# Altium footprint library MyComponents_v2.5.PcbLib: 403 footprints (part 14 of 26)
Each footprint in its own frame and in the unit in brackets; x right, y up, seen from the top. Pads: shape width x height; smd on the part's side, far side on the other; paste and mask are expansions set on the pad; w line width, h text height; cw(c..) or ccw(c..) is an arc to the next point about the centre after c.
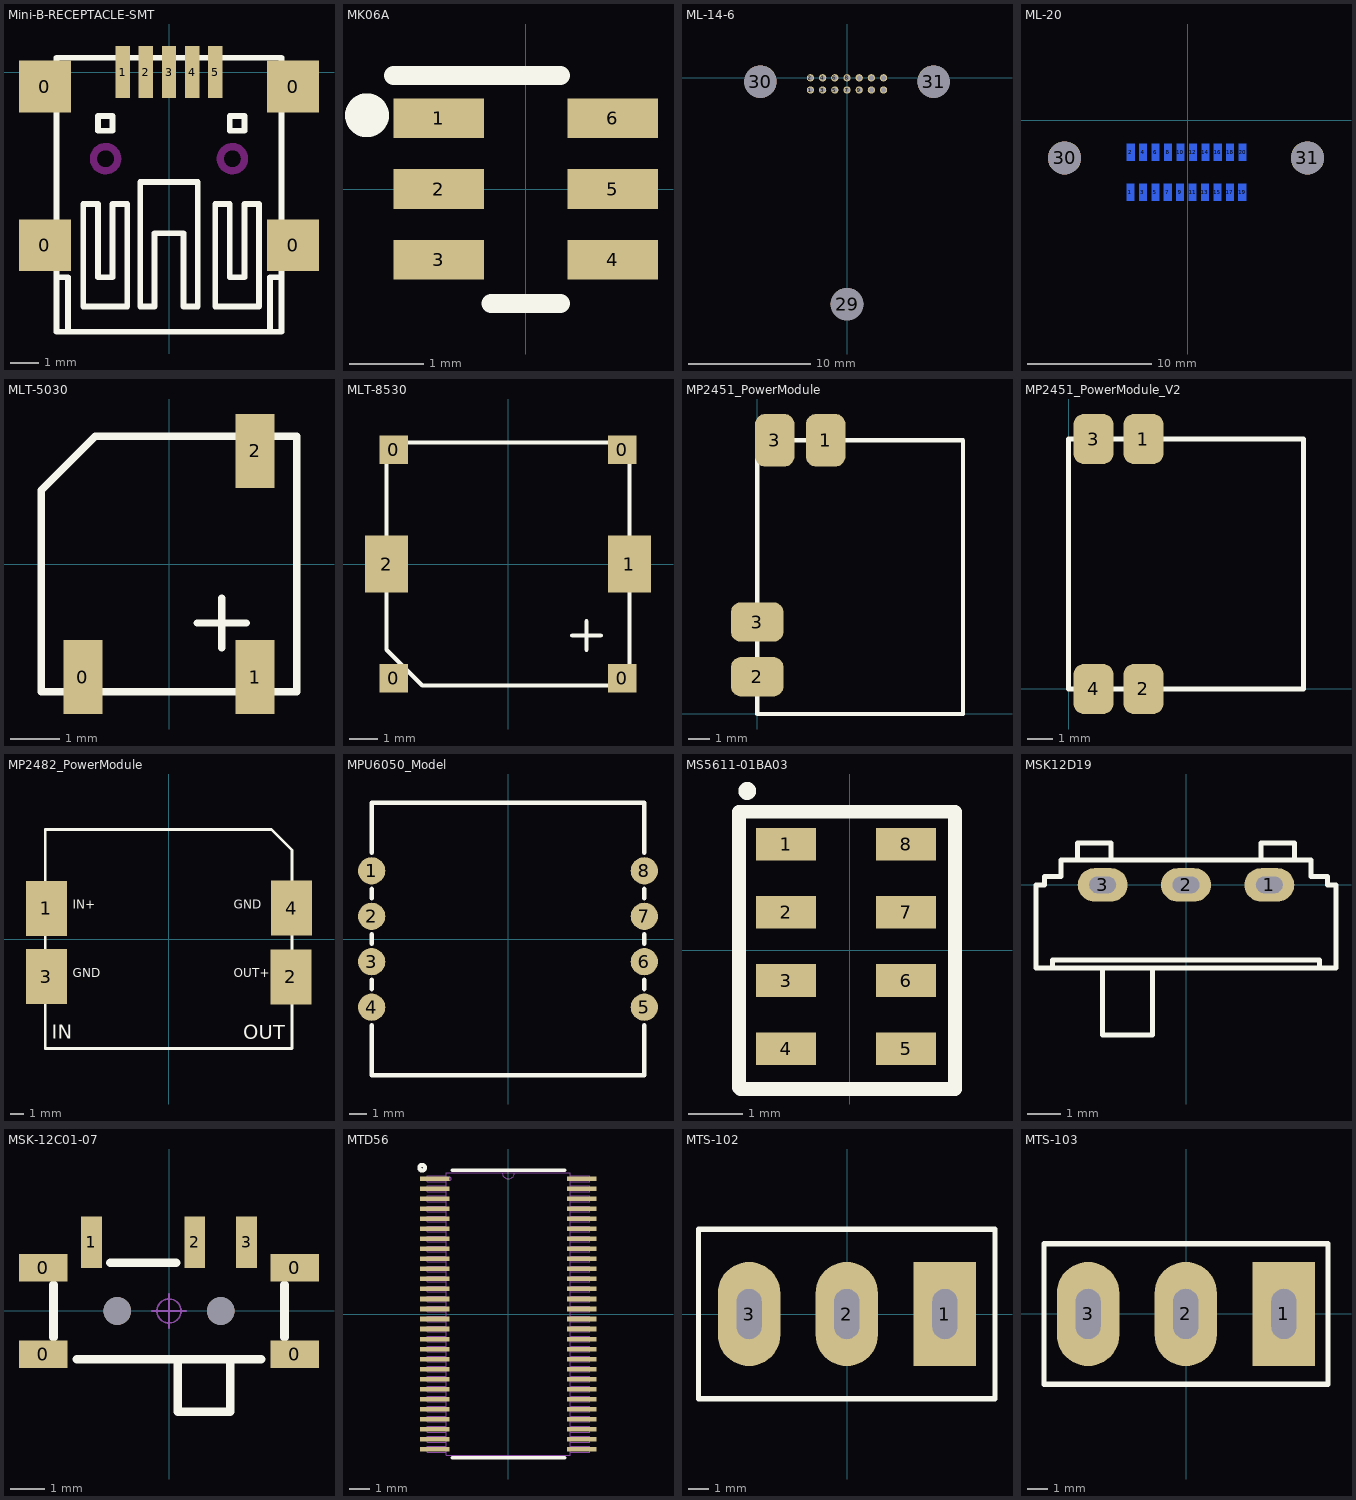
[diagram p13: the footprints below, top view; thin cyan lines are the x and y axes]

## Mini-B-RECEPTACLE-SMT [mm]
pads (9):
  rect 1.8x1.8 smd: 0(-4.3,-6) 0(-4.3,-0.5) 0(4.3,-6) 0(4.3,-0.5)
  rect 0.5x1.8 smd: 1(-1.6,0) 2(-0.8,0) 3(0,0) 4(0.8,0) 5(1.6,0)
Top Overlay:
  lines w0.2: -3.9,-7.112 -3.5,-7.112 -3.5,-9 ; 3.5,-9 3.5,-7.112 3.9,-7.112 ; -3.9,-9 3.9,-9 3.9,0.5 -3.9,0.5 -3.9,-9 ; -2.972,-8.128 -2.972,-4.572 -2.464,-4.572 -2.464,-7.112 -1.956,-7.112 -1.956,-4.572 -1.448,-4.572 -1.448,-8.128 -2.972,-8.128 ; -2.464,-2.032 -1.956,-2.032 -1.956,-1.524 -2.464,-1.524 -2.464,-2.032 ; -1,-8.128 -0.5,-8.128 -0.5,-5.588 0.5,-5.588 0.5,-8.128 1,-8.128 1,-3.81 -1,-3.81 -1,-8.128 ; 1.6,-8.128 1.6,-4.572 2.108,-4.572 2.108,-7.112 2.616,-7.112 2.616,-4.572 3.124,-4.572 3.124,-8.128 1.6,-8.128 ; 2.108,-2.032 2.616,-2.032 2.616,-1.524 2.108,-1.524 2.108,-2.032
Bottom Overlay:
  lines w0.2: -3.9,-7.112 -3.5,-7.112 -3.5,-9 ; 3.5,-9 3.5,-7.112 3.9,-7.112 ; -3.9,-9 -3.9,0.5 3.9,0.5 3.9,-9 -3.9,-9
Keep-Out Layer:
  circle w0.254: c-2.2,-3 r0.42
  circle w0.254: c2.2,-3 r0.42
3D body "usb_a-usb_b-m5-smd-c.stp": height 3.93, standoff -1, extent -5.077,-9.017 4.823,0.233

## MK06A [mil]
pads (6):
  rect 48x21 smd: 1(-46,37.4) 2(-46,0) 3(-46,-37.4) 4(46,-37.4) 5(46,0) 6(46,37.4)
Top Overlay:
  circle w13.78: c-84,39 r4.72
  lines w10: -70,60 18.41,60 ; -18.41,-60.5 18.41,-60.5
3D body "MK06A.stp": height 39.1, standoff 0, extent -56,-60.5 56,60.5

## ML-14-6 [mm]
pads (17):
  round 0.6 hole 0.4: 1(-3,-1) 2(-3,0) 3(-2,-1) 4(-2,0) 5(-1,-1) 6(-1,0) 7(0,-1) 8(0,0) 9(1,-1) 10(1,0) 11(2,-1) 12(2,0) 13(3,-1) 14(3,0)
  round 2.667 hole 2.667: 29(0,-18.56) 30(-7.1,-0.31) 31(7.1,-0.31)
Bottom Overlay:
  region: -11.2,2.7 -11.2,-19.7 11.2,-19.7 11.2,2.7
  lines w0.152: -11.367,-21.426 -11.367,3.187 11.367,3.187 11.367,-21.426 -11.367,-21.426
3D body "ADiS16460_3DModel.STEP": height -0.51, standoff -9.51, extent -11.266,-21.257 11.227,3.043
3D body "female_header_2x7 1mm.STEP": height 1.5, standoff -2.5, extent -3.737,-1.758 3.763,0.742

## ML-20 [mil]
pads (22):
  rect 24x54 smd far side: 1(-181.11,-228.31) 2(-180.11,-102.32) 3(-141.74,-228.31) 4(-140.74,-102.32) 5(-102.37,-228.31) 6(-101.37,-102.32) 7(-63,-228.31) 8(-62,-102.32) 9(-23.63,-228.31) 10(-22.63,-102.32) 11(15.74,-228.31) 12(16.74,-102.32) 13(55.11,-228.31) 14(56.11,-102.32) 15(94.48,-228.31) 16(95.48,-102.32) 17(133.85,-228.31) 18(134.85,-102.32) 19(173.22,-228.31) 20(174.22,-102.32)
  round 105 / inner round 60 / far side round 105 hole 105: 30(-389.9,-119.66) 31(379.79,-119.66)
Bottom Overlay:
  lines w3.94: -251.12,-20.3 240.9,-20.3
  lines w5.91: 240.9,-20.3 241.01,-20.19
  lines w6: -480.45,-416.55 -480.45,-20.18 ; 470.34,-416.55 470.34,-20.18
  lines w9.84: -480.45,-416.55 -480.45,-20.18 -251,-20.18 -251.12,-20.3 -251.12,-329.5 241.01,-329.5 241.01,-20.19 ; 470.34,-416.55 470.34,-20.18 ; 241.01,-20.19 470.33,-20.19 ; 241,-20.18 241.01,-20.19 ; 470.33,-20.19 470.34,-20.18
3D body "ADIS16448-3D-Package.STEP": height -17.97, standoff -450.89, extent -477.4,-1509.25 473.39,-25

## MLT-5030 [mm] "MLT5020/MLT5025/MLT5030"
pads (3):
  rect 0.8x1.5 smd: 0(-1.75,-2.3) 1(1.75,-2.3) 2(1.75,2.3)
Top Overlay:
  lines w0.15: 0.575,-1.2 1.575,-1.2 ; 1.075,-1.7 1.075,-0.7 ; -2.6,-2.6 2.6,-2.6 2.6,2.6 -1.5,2.6 -2.6,1.5 -2.6,-2.6
3D body "MLT5023s-smt.stp": height 2, standoff 0, extent -2.5,-2.5 2.5,2.5
3D body "MLT5023s-smt.stp": height 2, standoff 0, extent -2.5,-2.5 2.5,2.5

## MLT-8530 [mm]
pads (6):
  rect 1x1 smd: 0(-4,-4) 0(-4,4) 0(4,-4) 0(4,4)
  rect 1.5x2 smd: 1(4.25,0) 2(-4.25,0)
Top Overlay:
  lines w0.15: 2.25,-2.5 3.25,-2.5 ; 2.75,-3 2.75,-2 ; -4.25,-3 -4.25,4.25 4.25,4.25 4.25,-4.25 -3,-4.25 -4.25,-3
3D body "MLT-8530.step": height 3, standoff 0, extent -4.25,-4.25 4.25,4.25
3D body "MLT-8530.step": height 3, standoff 0, extent -4.25,-4.25 4.25,4.25

## MP2451_PowerModule [mm]
pads (4):
  rrect50% 1.8x2.4 smd: 1(3.125,12.5) 3(0.8,12.5)
  rrect50% 2.4x1.8 smd: 2(0,1.7) 3(0,4.2)
Top Overlay:
  lines w0.2: 0,0 9.4,0 9.4,12.5 0,12.5 0,0
3D body: height 2.05, standoff -0.41, extent 0,0 9.4,12.5
3D body "MP2451_PowerModule.step": height 2.55, standoff 0.09, extent 0,0 9.4,12.5

## MP2451_PowerModule_V2 [mm]
pads (4):
  rrect50% 1.6x2 smd: 1(3,10) 2(3,0) 3(1,10) 4(1,0)
Top Overlay:
  lines w0.2: 0,0 9.4,0 9.4,10 0,10 0,0
3D body "MP2451_PowerModule.step": height 2.6, standoff 0, extent 0,0 9.4,10

## MP2482_PowerModule [mm]
pads (4):
  rect 3x4 smd: 1(-8.925,2.236) 2(8.923,-2.768) 3(-8.925,-2.742) 4(8.974,2.262)
Top Overlay:
  lines w0.2: -9,-8 9,-8 9,6.25 9,6.5 7.5,8 -9,8 -9,-8
  text "OUT+" at 4.75,-3 h1.1
  text "IN+" at -7,2 h1.1
  text "IN" at -8.517,-7.644 h1.8
  text "OUT" at 5.427,-7.67 h1.8
  text "GND" at -7,-3 h1.1
  text "GND" at 4.75,2 h1.1
3D body "MP2482_PowerModule.step": height 3.95, standoff 0, extent -9,-8 9,8

## MPU6050_Model [mil]
pads (8):
  round 60 smd: 1(-300,150) 2(-300,50) 3(-300,-50) 4(-300,-150) 5(300,-150) 6(300,-50) 7(300,50) 8(300,150)
Top Overlay:
  lines w10: -300,-190 -300,-300 300,-300 300,-190 ; -300,-110 -300,-90 ; -300,-10 -300,10 ; -300,90 -300,110 ; -300,190 -300,300 300,300 300,190 ; 300,-110 300,-90 ; 300,-10 300,10 ; 300,90 300,110

## MS5611-01BA03 [mm] "气压计MS5611封装"
pads (8):
  rect 1.1x0.6 smd: 1(-1.168,1.947) 2(-1.168,0.697) 3(-1.168,-0.553) 4(-1.168,-1.803) 5(1.032,-1.803) 6(1.032,-0.553) 7(1.032,0.697) 8(1.032,1.947)
Top Overlay:
  circle w0.254: c-1.88,2.921 r0.036
  lines w0.254: -2.032,-2.515 -2.007,-2.54 1.93,-2.54 1.93,2.54 -2.032,2.54 -2.032,-2.515

## MSK12D19 [mm]
pads (3):
  oval 1.5x1 hole 0.5 slot 0.8 at 0 deg: 1(2.5,0) 2(0,0) 3(-2.5,0)
Top Overlay:
  lines w0.15: -4,-2.5 -4,-2.25 4,-2.25 4,-2.5 ; -3.25,0.75 -3.25,1.25 -2.25,1.25 -2.25,0.75 ; -2.5,-2.5 -2.5,-4.5 -1,-4.5 -1,-2.5 ; 2.25,0.75 2.25,1.25 3.25,1.25 3.25,0.75 ; -4.5,-2.5 -4.5,0 -4.25,0 -4.25,0.25 -3.75,0.25 -3.75,0.75 0,0.75 3.75,0.75 3.75,0.25 4.25,0.25 4.25,0 4.5,0 4.5,-2.5 0,-2.5 -4.5,-2.5
3D body "MSK12D19.step": height 4.05, standoff -2.75, extent -4.25,-4.75 4.25,0.75

## MSK-12C01-07 [mm] "6.7*2.8*1.5mm(长宽高）拨动开关"
pads (9):
  rect 1.4x0.8 smd: 0(-3.65,-1.25) 0(-3.65,1.25) 0(3.65,-1.25) 0(3.65,1.25)
  rect 0.6x1.5 smd: 1(-2.25,1.996) 2(0.75,1.996) 3(2.25,1.996)
  round 0.8 hole 0.8: " "(-1.5,0) " "(1.5,0)
Top Overlay:
  lines w0.254: -3.35,-0.762 -3.35,0.762 ; -2.667,-1.397 2.667,-1.397 ; -1.699,1.397 0.206,1.397 ; 0.254,-1.4 0.254,-2.921 1.778,-2.921 1.778,-1.4 ; 3.35,-0.762 3.35,0.762
Mechanical 15:
  circle w0.05: c0,0 r0.35
  lines w0.05: -0.5,0 0.5,0 ; 0,-0.5 0,0.5
3D body "MSK-12C01-07.STEP": height 1.4, standoff -0.5, extent -3.9,-2.85 3.9,2.35

## MTD56 [mil]
pads (56):
  rect 58x9 smd: 1(-144.5,265.75) 2(-144.5,246.06) 3(-144.5,226.38) 4(-144.5,206.69) 5(-144.5,187.01) 6(-144.5,167.32) 7(-144.5,147.64) 8(-144.5,127.95) 9(-144.5,108.27) 10(-144.5,88.58) 11(-144.5,68.9) 12(-144.5,49.21) 13(-144.5,29.53) 14(-144.5,9.84) 15(-144.5,-9.84) 16(-144.5,-29.53) 17(-144.5,-49.21) 18(-144.5,-68.9) 19(-144.5,-88.58) 20(-144.5,-108.27) 21(-144.5,-127.95) 22(-144.5,-147.64) 23(-144.5,-167.32) 24(-144.5,-187.01) 25(-144.5,-206.69) 26(-144.5,-226.38) 27(-144.5,-246.06) 28(-144.5,-265.75) 29(144.5,-265.75) 30(144.5,-246.06) 31(144.5,-226.38) 32(144.5,-206.69) 33(144.5,-187.01) 34(144.5,-167.32) 35(144.5,-147.64) 36(144.5,-127.95) 37(144.5,-108.27) 38(144.5,-88.58) 39(144.5,-68.9) 40(144.5,-49.21) 41(144.5,-29.53) 42(144.5,-9.84) 43(144.5,9.84) 44(144.5,29.53) 45(144.5,49.21) 46(144.5,68.9) 47(144.5,88.58) 48(144.5,108.27) 49(144.5,127.95) 50(144.5,147.64) 51(144.5,167.32) 52(144.5,187.01) 53(144.5,206.69) 54(144.5,226.38) 55(144.5,246.06) 56(144.5,265.75)
Top Overlay:
  circle w8: c-169.29,287.4 r5.57
  lines w6: -110.86,-282.5 110.86,-282.5 ; -110.86,282.5 110.86,282.5
Mechanical 13:
  drawing of 230 lines, arcs and shapes, not listed
3D body: height 10, standoff 0, extent -20,-25 -20,-25
3D body: height 10, standoff 0, extent 5,-25 110,-20
3D body "DGG0056A.stp": height 43.31, standoff 0, extent -159.86,-275.58 159.86,275.6

## MTS-102 [mm] "3A/250V 6A/125V"
pads (3):
  rect 3x5 hole 1.2 slot 2.4 at 90 deg: 1(4.7,0)
  oval 3x5 hole 1.2 slot 2.4 at 90 deg: 2(-0.013,0) 3(-4.7,0)
Top Overlay:
  lines w0.254: -7.125,-4.064 7.099,-4.064 7.099,4.064 -7.125,4.064 -7.125,-4.064
3D body "55636avde.stp": height 33.36, standoff -2.35, extent -6.6,-3.935 6.6,4.064

## MTS-103 [mm] "3A/250V 6A/125V"
pads (3):
  rect 3x5 hole 1.2 slot 2.4 at 90 deg: 1(4.7,0)
  oval 3x5 hole 1.2 slot 2.4 at 90 deg: 2(-0.013,0) 3(-4.7,0)
Top Overlay:
  lines w0.254: -6.813,-3.375 6.812,-3.375 6.812,3.375 -6.813,3.375 -6.813,-3.375
3D body "5632a9.stp": height 32.49, standoff -2.65, extent -6.606,-4 6.606,4